# Altium footprint library lib_datalogger.PcbLib: 866 footprints (part 1 of 55)
Each footprint in its own frame and in the unit in brackets; x right, y up, seen from the top. Pads: shape width x height; smd on the part's side, far side on the other; paste and mask are expansions set on the pad; w line width, h text height; cw(c..) or ccw(c..) is an arc to the next point about the centre after c.
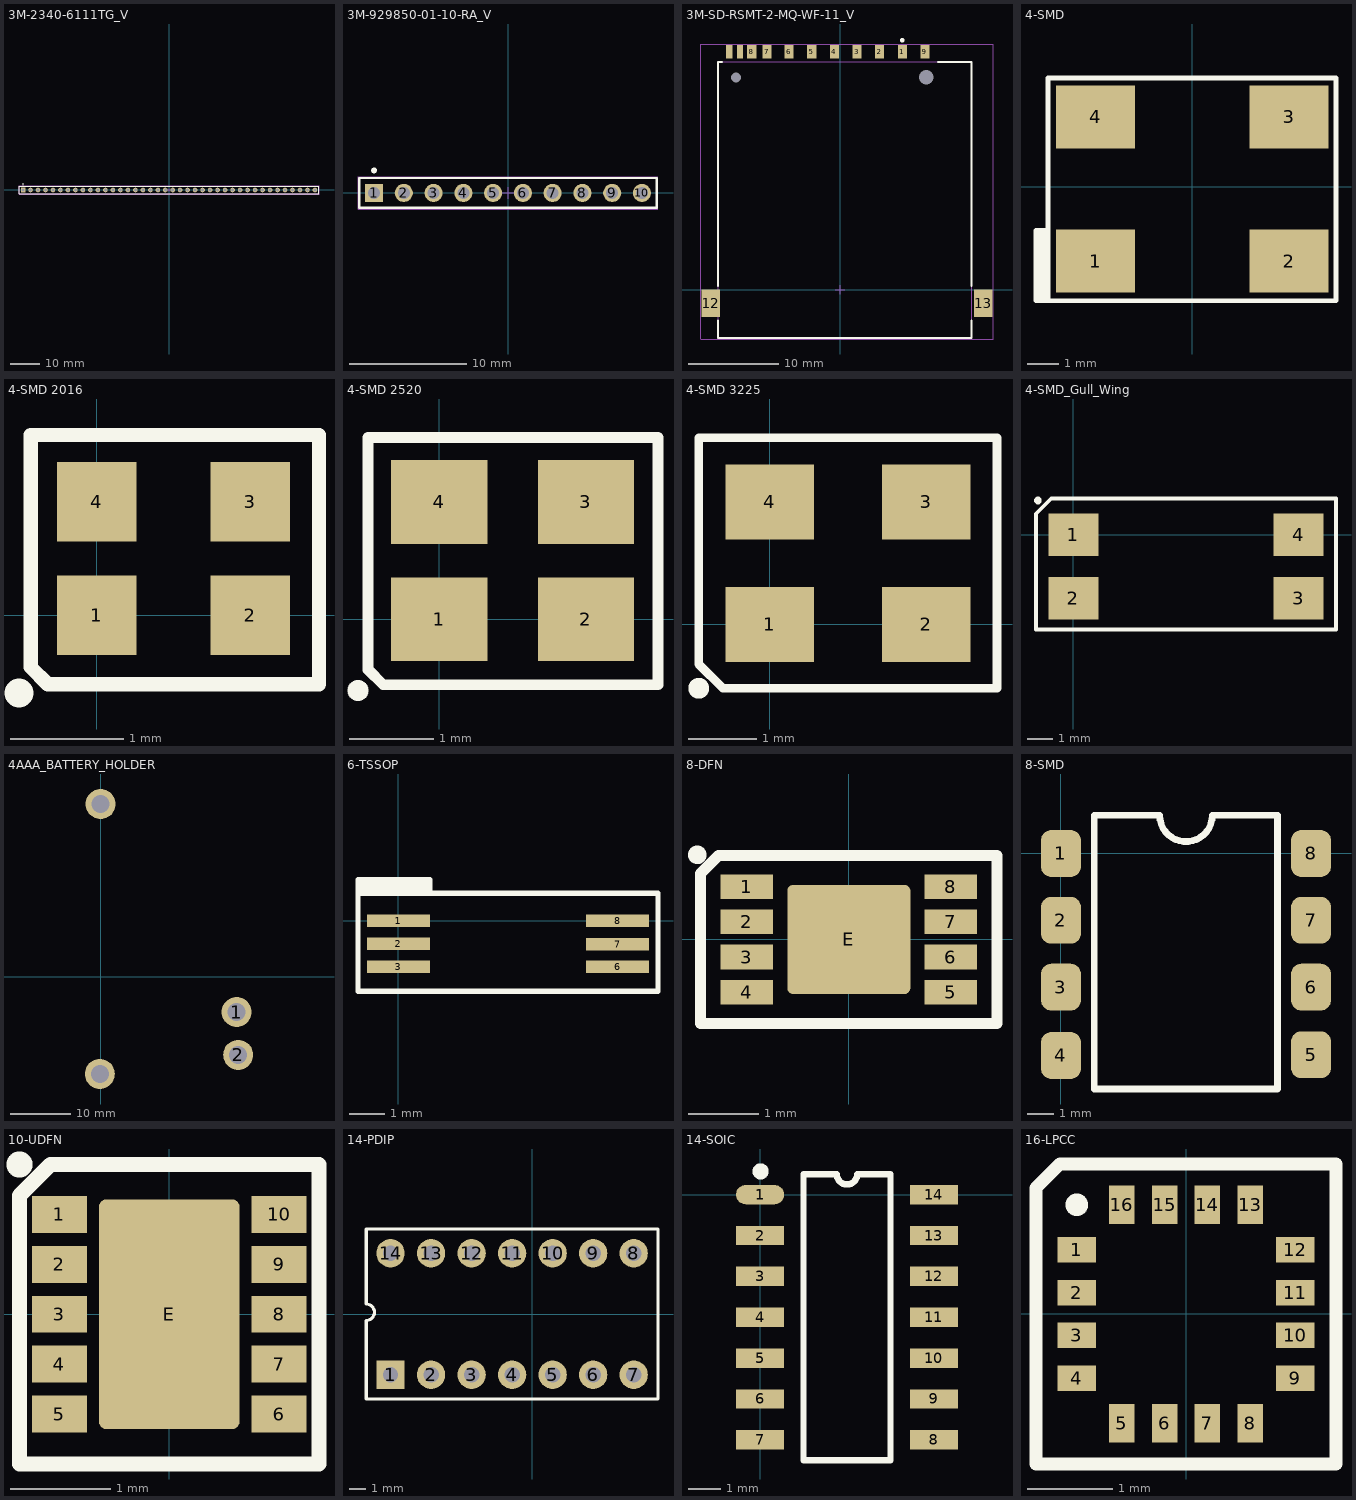
[diagram p0: the footprints below, top view; thin cyan lines are the x and y axes]

## 3M-2340-6111TG_V [mm] "THD, 40-Leads, Body 101.6x2.54mm, Pitch 2.54mm"
height 8.636
pads (40):
  rect 1.55x1.55 hole 1.02: 1(-49.53,0)
  round 1.55 hole 1.02: 2(-46.99,0) 3(-44.45,0) 4(-41.91,0) 5(-39.37,0) 6(-36.83,0) 7(-34.29,0) 8(-31.75,0) 9(-29.21,0) 10(-26.67,0) 11(-24.13,0) 12(-21.59,0) 13(-19.05,0) 14(-16.51,0) 15(-13.97,0) 16(-11.43,0) 17(-8.89,0) 18(-6.35,0) 19(-3.81,0) 20(-1.27,0) 21(1.27,0) 22(3.81,0) 23(6.35,0) 24(8.89,0) 25(11.43,0) 26(13.97,0) 27(16.51,0) 28(19.05,0) 29(21.59,0) 30(24.13,0) 31(26.67,0) 32(29.21,0) 33(31.75,0) 34(34.29,0) 35(36.83,0) 36(39.37,0) 37(41.91,0) 38(44.45,0) 39(46.99,0) 40(49.53,0)
Top Overlay:
  circle w0.25: c-49.53,1.92 r0.125
  lines w0.2: -50.8,-1.27 50.8,-1.27 50.8,1.27 -50.8,1.27 -50.8,-1.27
Mechanical 13:
  lines w0.1: -50.8,-1.27 50.8,-1.27 50.8,1.27 -50.8,1.27 -50.8,-1.27
Mechanical 15:
  lines w0.05: -50.9,-1.37 50.9,-1.37 50.9,1.37 -50.9,1.37 -50.9,-1.37
  lines w0.1: -0.5,0 0.5,0 ; 0,-0.5 0,0.5
3D body: height 2.54, standoff 0, extent -50.8,-1.27 50.8,1.27
3D body: height 8.64, standoff -3.05, extent 49.21,-0.32 49.85,0.32
3D body: height 8.64, standoff -3.05, extent 46.67,-0.32 47.31,0.32
3D body: height 8.64, standoff -3.05, extent 44.13,-0.32 44.77,0.32
3D body: height 8.64, standoff -3.05, extent 41.59,-0.32 42.23,0.32
3D body: height 8.64, standoff -3.05, extent 39.05,-0.32 39.69,0.32
3D body: height 8.64, standoff -3.05, extent 36.51,-0.32 37.15,0.32
3D body: height 8.64, standoff -3.05, extent 33.97,-0.32 34.61,0.32
3D body: height 8.64, standoff -3.05, extent 31.43,-0.32 32.07,0.32
3D body: height 8.64, standoff -3.05, extent 28.89,-0.32 29.53,0.32
3D body: height 8.64, standoff -3.05, extent 26.35,-0.32 26.99,0.32
3D body: height 8.64, standoff -3.05, extent 23.81,-0.32 24.45,0.32
3D body: height 8.64, standoff -3.05, extent 21.27,-0.32 21.91,0.32
3D body: height 8.64, standoff -3.05, extent 16.19,-0.32 16.83,0.32
3D body: height 8.64, standoff -3.05, extent 18.73,-0.32 19.37,0.32
3D body: height 8.64, standoff -3.05, extent 13.65,-0.32 14.29,0.32
3D body: height 8.64, standoff -3.05, extent 11.11,-0.32 11.75,0.32
3D body: height 8.64, standoff -3.05, extent 8.57,-0.32 9.21,0.32
3D body: height 8.64, standoff -3.05, extent 6.03,-0.32 6.67,0.32
3D body: height 8.64, standoff -3.05, extent 3.49,-0.32 4.13,0.32
3D body: height 8.64, standoff -3.05, extent 0.95,-0.32 1.59,0.32
3D body: height 8.64, standoff -3.05, extent -4.13,-0.32 -3.49,0.32
3D body: height 8.64, standoff -3.05, extent -6.67,-0.32 -6.03,0.32
3D body: height 8.64, standoff -3.05, extent -9.21,-0.32 -8.57,0.32
3D body: height 8.64, standoff -3.05, extent -11.75,-0.32 -11.11,0.32
3D body: height 8.64, standoff -3.05, extent -14.29,-0.32 -13.65,0.32
3D body: height 8.64, standoff -3.05, extent -16.83,-0.32 -16.19,0.32
3D body: height 8.64, standoff -3.05, extent -19.37,-0.32 -18.73,0.32
3D body: height 8.64, standoff -3.05, extent -21.91,-0.32 -21.27,0.32
3D body: height 8.64, standoff -3.05, extent -24.45,-0.32 -23.81,0.32
3D body: height 8.64, standoff -3.05, extent -26.99,-0.32 -26.35,0.32
3D body: height 8.64, standoff -3.05, extent -29.53,-0.32 -28.89,0.32
3D body: height 8.64, standoff -3.05, extent -32.07,-0.32 -31.43,0.32
3D body: height 8.64, standoff -3.05, extent -34.61,-0.32 -33.97,0.32
3D body: height 8.64, standoff -3.05, extent -37.15,-0.32 -36.51,0.32
3D body: height 8.64, standoff -3.05, extent -39.69,-0.32 -39.05,0.32
3D body: height 8.64, standoff -3.05, extent -42.23,-0.32 -41.59,0.32
3D body: height 8.64, standoff -3.05, extent -44.77,-0.32 -44.13,0.32
3D body: height 8.64, standoff -3.05, extent -47.31,-0.32 -46.67,0.32
3D body: height 8.64, standoff -3.05, extent -49.85,-0.32 -49.21,0.32
3D body: height 8.64, standoff -3.05, extent -1.59,-0.32 -0.95,0.32

## 3M-929850-01-10-RA_V [mm] "THD, 10-Leads, Body 25.4x2.54mm, Pitch 2.54mm"
height 8.26
pads (10):
  rect 1.55x1.55 hole 1.02: 1(-11.43,0)
  round 1.55 hole 1.02: 2(-8.89,0) 3(-6.35,0) 4(-3.81,0) 5(-1.27,0) 6(1.27,0) 7(3.81,0) 8(6.35,0) 9(8.89,0) 10(11.43,0)
Top Overlay:
  circle w0.25: c-11.43,1.92 r0.125
  lines w0.2: -12.7,-1.27 -12.7,1.27 12.7,1.27 12.7,-1.27 -12.7,-1.27
Mechanical 13:
  lines w0.1: -12.7,-1.27 -12.7,1.27 12.7,1.27 12.7,-1.27 -12.7,-1.27
Mechanical 15:
  lines w0.05: -12.8,-1.37 12.8,-1.37 12.8,1.37 -12.8,1.37 -12.8,-1.37
  lines w0.1: -0.5,0 0.5,0 ; 0,-0.5 0,0.5
3D body: height 8.26, standoff 0, extent -12.7,-1.27 12.7,1.27
3D body: height 0, standoff -3.18, extent -9.094,-0.379 -8.686,0.379
3D body: height 0, standoff -3.18, extent -11.634,-0.379 -11.226,0.379
3D body: height 0, standoff -3.18, extent -6.554,-0.379 -6.146,0.379
3D body: height 0, standoff -3.18, extent -4.014,-0.379 -3.606,0.379
3D body: height 0, standoff -3.18, extent -1.474,-0.379 -1.066,0.379
3D body: height 0, standoff -3.18, extent 3.606,-0.379 4.014,0.379
3D body: height 0, standoff -3.18, extent 1.066,-0.379 1.474,0.379
3D body: height 0, standoff -3.18, extent 6.146,-0.379 6.554,0.379
3D body: height 0, standoff -3.18, extent 8.686,-0.379 9.094,0.379
3D body: height 0, standoff -3.18, extent 11.226,-0.379 11.634,0.379

## 3M-SD-RSMT-2-MQ-WF-11_V [mm] "SMD, 9-Leads, Body 30.5x28mm"
height 3.1
pads (15):
  rect 1x1.5 smd: 1(6.88,26.25) 2(4.38,26.25) 3(1.88,26.25) 4(-0.62,26.25) 5(-3.12,26.25) 6(-5.62,26.25) 7(-8.05,26.25) 8(-9.75,26.25) 9(9.38,26.25)
  rect 0.7x1.5 smd: 10(-11.05,26.25) 11(-12.25,26.25)
  rect 2x3 smd: 12(-14.28,-1.5) 13(15.82,-1.5)
  round 1.3 hole 1.6 unplated: MH1(9.5,23.45)
  round 0.8 hole 1.1 unplated: MH2(-11.5,23.45)
Top Overlay:
  circle w0.25: c6.88,27.552 r0.127
  lines w0.2: -13.47,-3.4 -13.47,-5.35 14.53,-5.35 14.53,-3.4 ; -13.47,0.4 -13.47,25.15 ; -13.462,25.15 -13.47,25.15 ; -13.027,25.15 -13.47,25.15 ; 10.83,25.15 14.53,25.15 14.53,0.4
Mechanical 13:
  lines w0.1: 13.72,25.15 14.53,25.15 ; 14.53,25.15 -13.47,25.15 -13.47,-5.35 14.53,-5.35 14.53,25.15
Mechanical 15:
  lines w0.05: -15.38,-5.45 -15.38,27.1 16.92,27.1 16.92,-5.45 -15.38,-5.45
  lines w0.1: -0.5,0 0.5,0 ; 0,-0.5 0,0.5
3D body: height 1, standoff 0, extent -10.795,-3.81 10.161,14.606
3D body: height 3.1, standoff 0, extent -13.469,-5.349 14.529,25.149

## 4-SMD [mil]
pads (4):
  rect 98x78 smd: 1(-120,-92) 2(120,-92) 3(120,87) 4(-120,87)
Top Overlay:
  region: -179,-141 -180,-54 -194,-54 -194,-141
  lines w6: -179,-54 -194,-54 -194,-141 -179,-141 ; -179,-141 178,-141 178,135 -179,135 -179,-141
3D body "CFPS72-73.step": height 59.45, standoff -0.39, extent -137.8,-100.93 137.8,95.93

## 4-SMD 2016 [mm]
pads (4):
  rect 0.7x0.7 smd: 1(0,0) 2(1.35,0) 3(1.35,1) 4(0,1)
Top Overlay:
  circle w0.254: c-0.686,-0.686 r0
  lines w0.127: 1.956,1.575 1.956,-0.61 -0.432,-0.61 -0.584,-0.457 -0.584,1.586 1.956,1.586
3D body "XRCGB32M000F2P00R0.STEP": height 0.7, standoff 0, extent -0.339,-0.292 1.661,1.308

## 4-SMD 2520 [mm]
pads (4):
  rect 1.15x1 smd: 1(0,0) 2(1.75,0) 3(1.75,1.4) 4(0,1.4)
Top Overlay:
  circle w0.254: c-0.97,-0.85 r0
  lines w0.127: -0.85,-0.6 -0.67,-0.78 2.61,-0.78 2.61,2.17 -0.85,2.17 -0.85,-0.6
3D body "CRY_2520.STEP": height 0.55, standoff 0, extent -0.37,-0.3 2.13,1.7

## 4-SMD 3225 [mm]
pads (4):
  rect 1.3x1.1 smd: 1(0,0) 2(2.3,0) 3(2.3,1.8) 4(0,1.8)
Top Overlay:
  circle w0.254: c-1.041,-0.94 r0.025
  lines w0.127: -1.041,-0.584 -1.041,2.74 3.341,2.74 3.341,-0.94 -0.686,-0.94 -1.041,-0.584
3D body "X3225.step": height 0.81, standoff 0, extent -0.45,-0.35 2.75,2.15

## 4-SMD_Gull_Wing [mm]
pads (4):
  rect 2x1.7 smd: 1(0,0) 2(0,-2.54) 3(9,-2.54) 4(9,0)
Top Overlay:
  circle w0.254: c-1.422,1.372 r0.025
  lines w0.152: -1.499,-3.785 10.499,-3.785 10.499,1.448 -0.889,1.448 -1.499,0.838 -1.499,-3.785
3D body "4-SMD.step": height 3.76, standoff 0, extent -0.58,-3.569 9.58,1.029

## 4AAA_BATTERY_HOLDER [mm]
pads (4):
  round 5 hole 3: 1(22.606,-5.842) 2(22.86,-12.954) ""(-0.127,-16.129) ""(0,28.702)
3D body "User Library-Battery Holder 4xAA.sldprt": height 16, standoff 0, extent -28.695,-31.779 38.305,31.221

## 6-TSSOP [mil]
pads (6):
  rect 70x14 smd: 1(0,0) 2(0,-25.59) 3(0,-51.18) 6(244,-51) 7(244,-26) 8(244,0)
Top Overlay:
  region: 35,31 35,46 -45,46 -45,31
  lines w6: 35,31 35,46 -45,46 -45,31 ; -45,31 289,31 289,-78.18 -45,-78.18 -45,-39 -45,31

## 8-DFN [mm]
height 0.9
pads (9):
  rect 0.75x0.35 smd: 1(-1.45,0.75) 2(-1.45,0.25) 3(-1.45,-0.25) 4(-1.45,-0.75) 5(1.45,-0.75) 6(1.45,-0.25) 7(1.45,0.25) 8(1.45,0.75)
  rrect10% 1.75x1.55 smd: E(0,0)
Top Overlay:
  circle w0.254: c-2.154,1.202 r0.005
  lines w0.152: -2.108,-1.194 -2.108,0.94 -1.854,1.194 2.108,1.194 2.108,-1.194 -2.108,-1.194
3D body "8MA2.step": height 0.6, standoff 0, extent -1.51,-1 1.51,1

## 8-SMD [mm]
height 3.5
pads (8):
  rrect50% 1.52x1.78 smd: 1(0,0) 2(0,-2.54) 3(0,-5.08) 4(0,-7.675) 5(9.5,-7.65) 6(9.5,-5.08) 7(9.5,-2.54) 8(9.5,0)
Top Overlay:
  lines w0.254: 1.27,-8.95 8.23,-8.95 8.23,1.448 5.75,1.448 cw(c4.75,1.448) 3.75,1.448 1.27,1.448 1.27,-8.95
3D body "User Library-pdip8-smd.STEP": height 5.08, standoff 0, extent -0.4,-8.73 9.9,1.18

## 10-UDFN [mm]
height 0.9
pads (11):
  rect 0.55x0.37 smd: 1(-1.1,1) 2(-1.1,0.5) 3(-1.1,0) 4(-1.1,-0.5) 5(-1.1,-1) 6(1.1,-1) 7(1.1,-0.5) 8(1.1,0) 9(1.1,0.5) 10(1.1,1)
  rrect10% 1.41x2.3 smd: E(0,0)
Top Overlay:
  circle w0.254: c-1.5,1.5 r0.005
  lines w0.152: -1.5,-1.5 1.5,-1.5 1.5,1.5 -1.19,1.5 -1.5,1.19 -1.5,-1.5
3D body "3x2DFN10.step": height 0.79, standoff -0.01, extent -1.01,-1.5 1.01,1.5

## 14-PDIP [mil] "DIP; 16 Leads; Row Spacing 7.62 mm; Pitch 2.54 mm"
height 200
pads (14):
  rect 70x70 hole 38: 1(-350,-150)
  round 70 hole 38: 2(-250,-150) 3(-150,-150) 4(-50,-150) 5(50,-150) 6(150,-150) 7(250,-150) 8(250,150) 9(150,150) 10(50,150) 11(-50,150) 12(-150,150) 13(-250,150) 14(-350,150)
Top Overlay:
  lines w7.87: -410,-210 -410,-16 ccw(c-410,4.3) -410,24.6 -410,210 310,210 310,-210 -410,-210
3D body "DIP-14.step": height 319.29, standoff 44.49, extent -425,-155.48 325,159.48

## 14-SOIC [mm]
pads (14):
  oval 1.5x0.6 smd mask+0.076: 1(0,0)
  rect 1.5x0.6 smd mask+0.076: 2(0,-1.27) 3(0,-2.54) 4(0,-3.81) 5(0,-5.08) 6(0,-6.35) 7(0,-7.62) 8(5.4,-7.62) 9(5.4,-6.35) 10(5.4,-5.08) 11(5.4,-3.81) 12(5.4,-2.54) 13(5.4,-1.27) 14(5.4,0)
Top Overlay:
  circle w0.254: c0.015,0.724 r0.125
  lines w0.2: 1.347,-8.255 4.053,-8.255 4.053,0.635 3.018,0.635 cw(c2.7,0.635) 2.382,0.635 1.347,0.635 1.347,-8.255
3D body "CircuitWorks-SO-14 (PIC16F684).step": height 1.6, standoff 0, extent -0.295,-8.155 5.695,0.535

## 16-LPCC [mm]
height 0.9
pads (16):
  rect 0.45x0.3 smd: 1(-1.275,0.75) 2(-1.275,0.25) 3(-1.275,-0.25) 4(-1.275,-0.75) 9(1.275,-0.75) 10(1.275,-0.25) 11(1.275,0.25) 12(1.275,0.75)
  rect 0.3x0.45 smd: 5(-0.75,-1.275) 6(-0.25,-1.275) 7(0.25,-1.275) 8(0.75,-1.275) 13(0.75,1.275) 14(0.25,1.275) 15(-0.25,1.275) 16(-0.75,1.275)
Top Overlay:
  circle w0.254: c-1.275,1.275 r0.005
  lines w0.152: -1.753,-1.753 1.753,-1.753 1.753,1.753 -1.473,1.753 -1.753,1.473 -1.753,-1.753
3D body "QFN16-1.step": height 0.89, standoff 0, extent -1.55,-1.55 1.55,1.55